# Altium footprint library std-th.PcbLib: 245 footprints (part 10 of 16)
Each footprint in its own frame and in the unit in brackets; x right, y up, seen from the top. Pads: shape width x height; smd on the part's side, far side on the other; paste and mask are expansions set on the pad; w line width, h text height; cw(c..) or ccw(c..) is an arc to the next point about the centre after c.
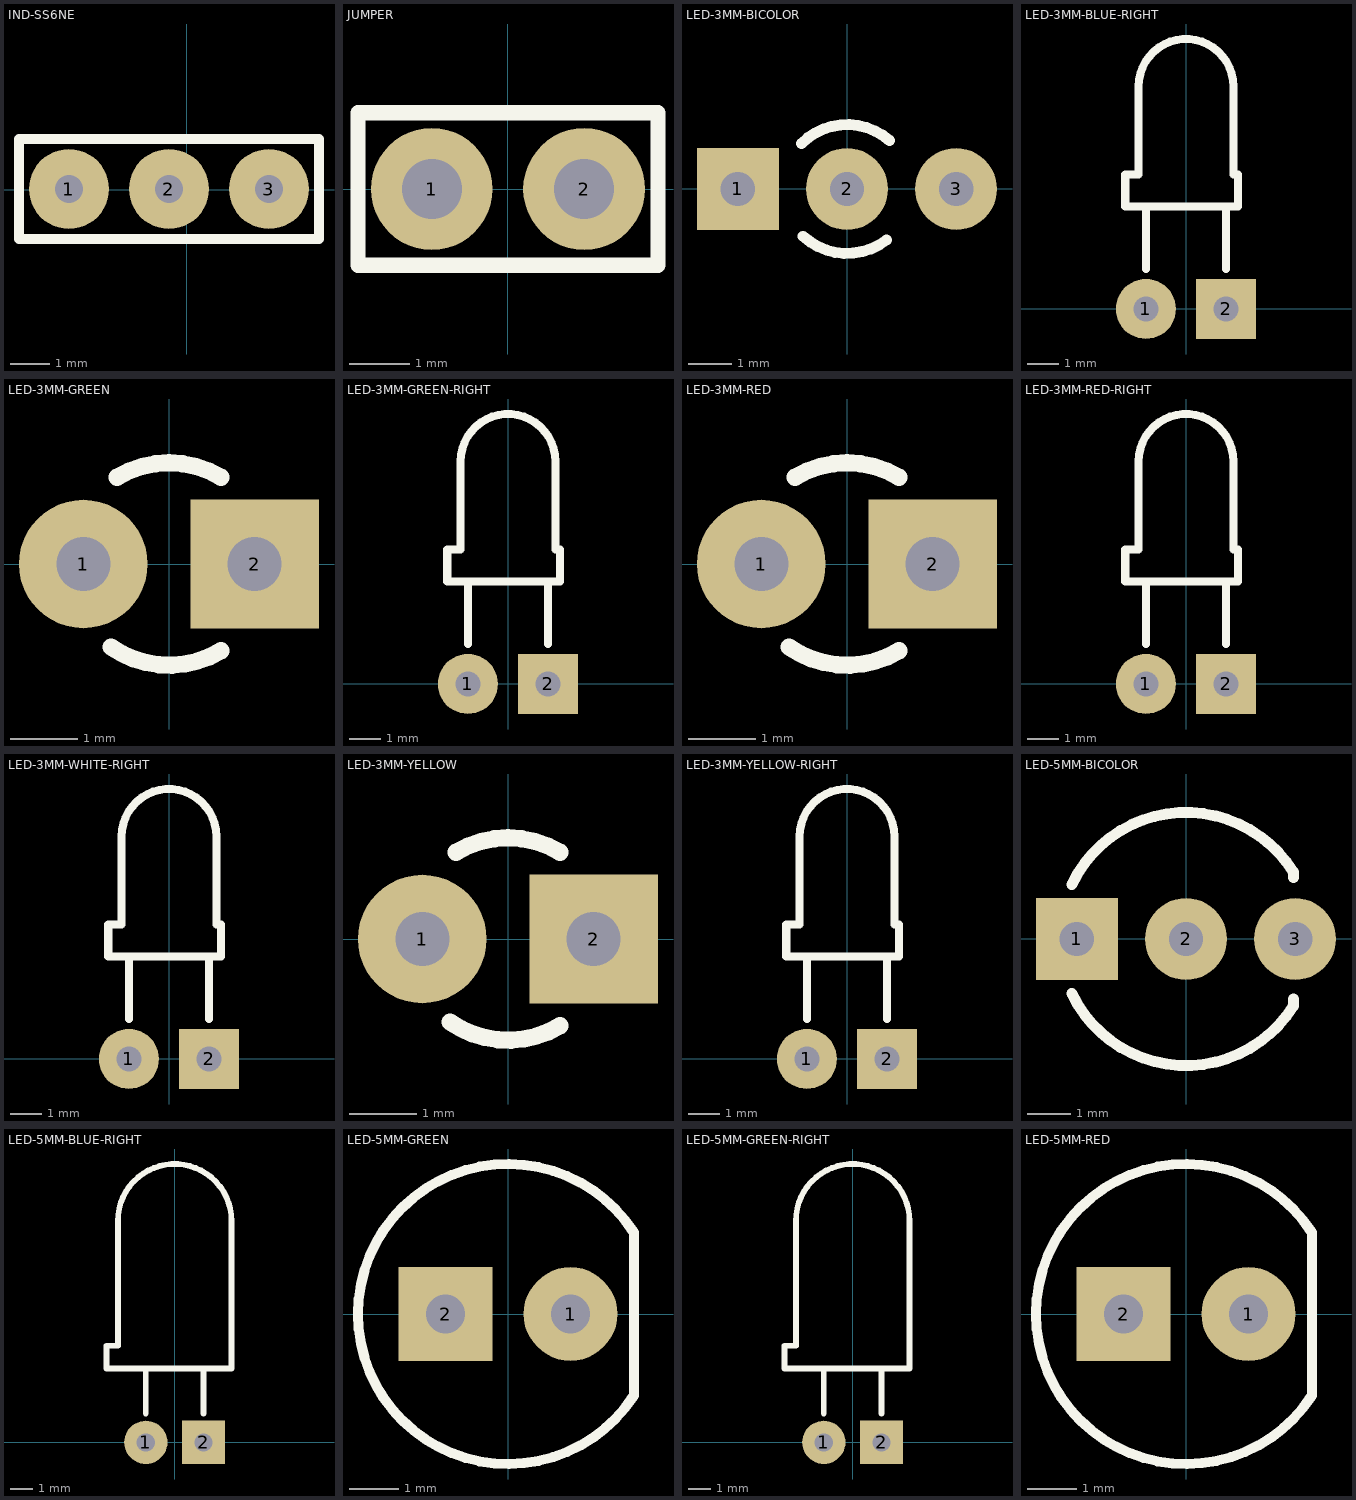
[diagram p9: the footprints below, top view; thin cyan lines are the x and y axes]

## IND-SS6NE [mil] "DSS6NE52A222Q55B Integrated line filter, 100 mil pitch"
height 196.85
pads (3):
  round 80 hole 27.56: 1(-117.83,0.66) 2(-17.83,0.66) 3(82.17,0.66)
Top Overlay:
  lines w10: -167.83,-49.25 -167.83,50.6 132.17,50.6 132.17,-49.25 -167.83,-49.25
3D body: height 281.9, standoff -62.17, extent -167.83,-49.25 132.17,50.6

## JUMPER [mil] "Jumper, 100 mil pitch"
height 314.96
pads (2):
  round 80 hole 39.37: 1(-50,0) 2(50,0)
Top Overlay:
  lines w10: -98.42,-49.99 -98.42,50.01 98.43,50.01 98.43,-49.99 -98.42,-49.99
3D body: height 374.02, standoff -102.36, extent -98.42,-49.99 98.43,50.01

## LED-3MM-BICOLOR [mm] "Bicolor LED 3 mm"
height 5
pads (3):
  rect 1.905x1.905 hole 0.8: 1(-2.54,0)
  round 1.905 hole 0.8: 2(0,0) 3(2.54,0)
Top Overlay:
  lines w0.254: -1.061,1.061 cw(c0,0) 0.987,1.129 ; -1.02,-1.1 ccw(c0,0) 0.921,-1.184
3D body: height 9.43, standoff -4, extent -2.25,-2 2.25,2

## LED-3MM-BLUE-RIGHT [mm] "LED, Blue, 3 mm, 100 mil pitch, right angle"
height 6
pads (2):
  round 1.905 hole 0.8: 1(-1.27,0)
  rect 1.905x1.905 hole 0.8: 2(1.27,0)
Top Overlay:
  lines w0.254: -1.27,1.27 -1.27,3.253 ; 1.27,1.27 1.27,3.253 ; -1.925,3.253 -1.925,4.253 -1.5,4.253 -1.5,7.053 cw(c0,7.053) 1.5,7.053 1.5,4.253 1.65,4.253 1.65,3.253 -1.925,3.253
3D body: height 3.83, standoff -1.85, extent -1.925,-0.25 1.65,8.554

## LED-3MM-GREEN [mm] "LED, Green, 3 mm, 100 mil pitch"
height 6
pads (2):
  round 1.905 hole 0.8: 1(-1.27,0)
  rect 1.905x1.905 hole 0.8: 2(1.27,0)
Top Overlay:
  lines w0.254: -0.86,-1.229 ccw(c0,0) 0.772,-1.286 ; -0.772,1.286 cw(c0,0) 0.772,1.286
3D body: height 5.51, standoff -2.49, extent -1.664,-1.648 1.636,1.64

## LED-3MM-GREEN-RIGHT [mm] "LED, Green, 3 mm, 100 mil pitch, right angle"
height 6
pads (2):
  round 1.905 hole 0.8: 1(-1.27,0)
  rect 1.905x1.905 hole 0.8: 2(1.27,0)
Top Overlay:
  lines w0.254: -1.27,1.27 -1.27,3.253 ; 1.27,1.27 1.27,3.253 ; -1.925,3.253 1.65,3.253 1.65,4.253 1.5,4.253 1.5,7.053 ccw(c0,7.053) -1.5,7.053 -1.5,4.253 -1.925,4.253 -1.925,3.253
3D body: height 3.83, standoff -1.85, extent -1.925,-0.25 1.65,8.554

## LED-3MM-RED [mm] "LED, Red 3 mm, 100 mil pitch"
height 6
pads (2):
  round 1.905 hole 0.8: 1(-1.27,0)
  rect 1.905x1.905 hole 0.8: 2(1.27,0)
Top Overlay:
  lines w0.254: -0.86,-1.229 ccw(c0,0) 0.772,-1.286 ; -0.772,1.286 cw(c0,0) 0.772,1.286
3D body: height 5.51, standoff -2.49, extent -1.664,-1.648 1.636,1.64

## LED-3MM-RED-RIGHT [mm] "LED, Red, 3 mm, 100 mil pitch, right angle"
height 6
pads (2):
  round 1.905 hole 0.8: 1(-1.27,0)
  rect 1.905x1.905 hole 0.8: 2(1.27,0)
Top Overlay:
  lines w0.254: -1.27,1.27 -1.27,3.253 ; 1.27,1.27 1.27,3.253 ; -1.925,3.253 1.65,3.253 1.65,4.253 1.5,4.253 1.5,7.053 ccw(c0,7.053) -1.5,7.053 -1.5,4.253 -1.925,4.253 -1.925,3.253
3D body: height 3.83, standoff -1.85, extent -1.925,-0.25 1.65,8.554

## LED-3MM-WHITE-RIGHT [mm] "LED, White, 3 mm, 100 mil pitch, right angle"
height 6
pads (2):
  round 1.905 hole 0.8: 1(-1.27,0)
  rect 1.905x1.905 hole 0.8: 2(1.27,0)
Top Overlay:
  lines w0.254: -1.27,1.27 -1.27,3.253 ; 1.27,1.27 1.27,3.253 ; -1.925,3.253 -1.925,4.253 -1.5,4.253 -1.5,7.053 cw(c0,7.053) 1.5,7.053 1.5,4.253 1.65,4.253 1.65,3.253 -1.925,3.253
3D body: height 3.83, standoff -1.85, extent -1.925,-0.25 1.65,8.554

## LED-3MM-YELLOW [mm] "LED, Yellow, 3 mm, 100 mil pitch"
height 6
pads (2):
  round 1.905 hole 0.8: 1(-1.27,0)
  rect 1.905x1.905 hole 0.8: 2(1.27,0)
Top Overlay:
  lines w0.254: -0.86,-1.229 ccw(c0,0) 0.772,-1.286 ; -0.772,1.286 cw(c0,0) 0.772,1.286
3D body: height 5.51, standoff -2.49, extent -1.664,-1.648 1.636,1.64

## LED-3MM-YELLOW-RIGHT [mm] "LED, Yellow, 3 mm, 100 mil pitch, right angle"
height 6
pads (2):
  round 1.905 hole 0.8: 1(-1.27,0)
  rect 1.905x1.905 hole 0.8: 2(1.27,0)
Top Overlay:
  lines w0.254: -1.27,1.27 -1.27,3.253 ; 1.27,1.27 1.27,3.253 ; -1.925,3.253 -1.925,4.253 -1.5,4.253 -1.5,7.053 cw(c0,7.053) 1.5,7.053 1.5,4.253 1.65,4.253 1.65,3.253 -1.925,3.253
3D body: height 3.83, standoff -1.85, extent -1.925,-0.25 1.65,8.554

## LED-5MM-BICOLOR [mm] "Bi Color LED 5 mm"
pads (3):
  rect 1.905x1.905 hole 0.8: 1(-2.54,0)
  round 1.905 hole 0.8: 2(0,0) 3(2.54,0)
Top Overlay:
  lines w0.254: -2.66,-1.267 ccw(c0,0) 2.501,-1.557 2.501,-1.397 ; -2.661,1.267 cw(c0,0) 2.502,1.556 2.501,1.436
3D body: height 10.82, standoff -2.62, extent -2.947,-2.946 2.794,2.946

## LED-5MM-BLUE-RIGHT [mm] "LED, Blue, 5 mm, 100 mil pitch, right angle"
height 6
pads (2):
  round 1.905 hole 0.8: 1(-1.27,0)
  rect 1.905x1.905 hole 0.8: 2(1.27,0)
Top Overlay:
  lines w0.254: -2.565,4.253 -3,4.253 -3,3.253 2.5,3.253 2.5,9.753 ccw(c0,9.753) -2.5,9.753 -2.5,4.253 ; -1.27,1.27 -1.27,3.253 ; 1.27,1.27 1.27,3.253
3D body: height 6.05, standoff -1.71, extent -3,-0.25 2.557,12.253

## LED-5MM-GREEN [mm] "Typical LED; green; 2 Leads, vertical"
height 8.636
pads (2):
  round 1.905 hole 0.8: 1(1.27,0)
  rect 1.905x1.905 hole 0.8: 2(-1.27,0)
Top Overlay:
  lines w0.203: 2.556,-1.661 cw(c0,0) 2.556,1.661 2.556,-1.661
3D body: height 12.31, standoff -2.49, extent -2.98,-3.01 2.44,3.01

## LED-5MM-GREEN-RIGHT [mm] "LED, Green, 5 mm, 100 mil pitch, right angle"
height 6
pads (2):
  round 1.905 hole 0.8: 1(-1.27,0)
  rect 1.905x1.905 hole 0.8: 2(1.27,0)
Top Overlay:
  lines w0.254: -2.565,4.253 -3,4.253 -3,3.253 2.5,3.253 2.5,9.753 ccw(c0,9.753) -2.5,9.753 -2.5,4.253 ; -1.27,1.27 -1.27,3.253 ; 1.27,1.27 1.27,3.253
3D body: height 6.05, standoff -1.71, extent -3,-0.25 2.557,12.254

## LED-5MM-RED [mm] "Typical LED; red; 2 Leads, vertical"
height 8.636
pads (2):
  round 1.905 hole 0.8: 1(1.27,0)
  rect 1.905x1.905 hole 0.8: 2(-1.27,0)
Top Overlay:
  lines w0.203: 2.556,-1.661 cw(c0,0) 2.556,1.661 2.556,-1.661
3D body: height 12.31, standoff -2.49, extent -2.98,-3.01 2.44,3.01